# Altium footprint library Wireless Security Board.PcbLib: 38 footprints (part 2 of 3)
Each footprint in its own frame and in the unit in brackets; x right, y up, seen from the top. Pads: shape width x height; smd on the part's side, far side on the other; paste and mask are expansions set on the pad; w line width, h text height; cw(c..) or ccw(c..) is an arc to the next point about the centre after c.
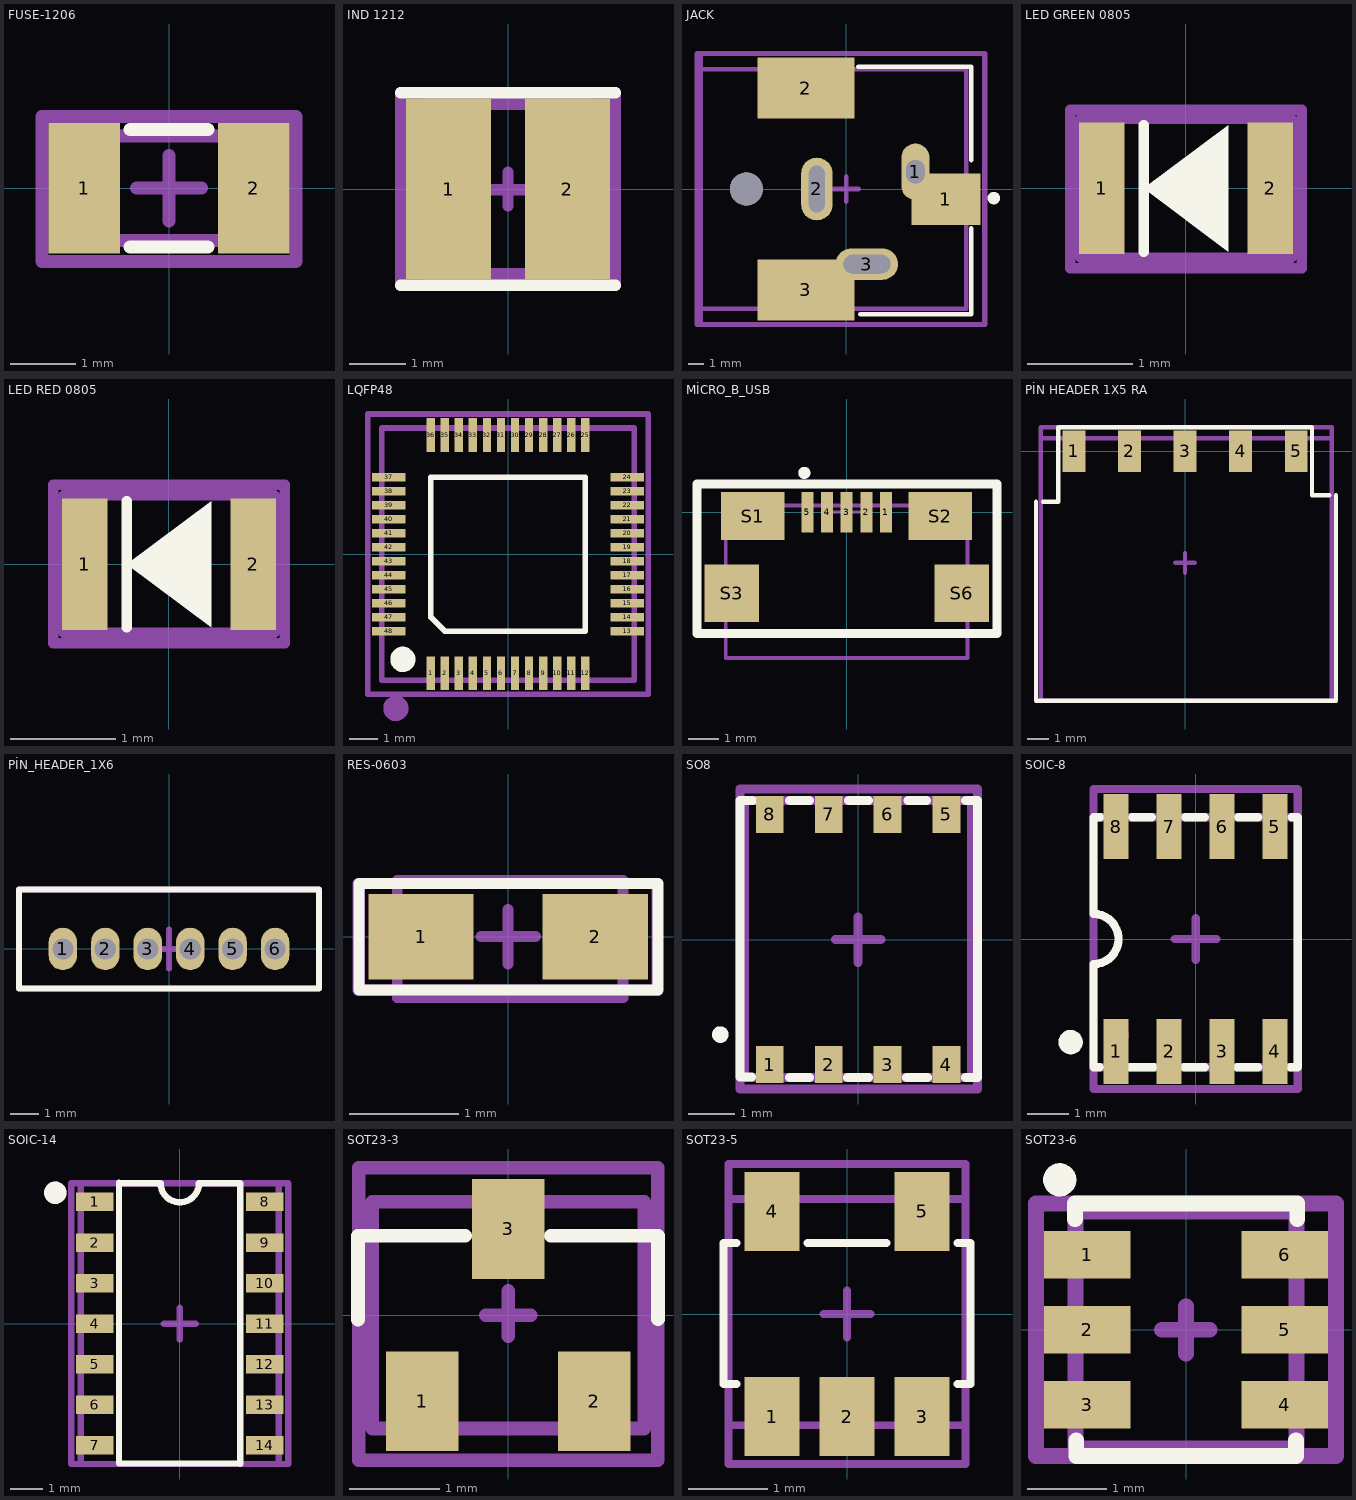
[diagram p1: the footprints below, top view; thin cyan lines are the x and y axes]

## FUSE-1206 [mm] "FUSE 3413.0216.22"
pads (2):
  rect 1.1x2 smd mask+0.05: 1(-1.3,0) 2(1.3,0)
Top Overlay:
  lines w0.2: -0.6,-0.9 0.6,-0.9 ; -0.6,0.9 0.6,0.9
Top 3D Body:
  lines w0.2: -1.6,-0.8 -1.6,0.8 1.6,0.8 1.6,-0.8 -1.6,-0.8
Top Component Center:
  lines w0.2: -0.5,0 0.5,0 ; 0,-0.5 0,0.5 ; -1.95,-1.125 -1.95,1.1 1.95,1.1 1.95,-1.125 -1.95,-1.125
Top Designator:
  lines w0.2: -1.95,-1.125 1.95,-1.125 1.95,1.1 -1.95,1.1 -1.95,-1.125
  text ".Designator" at -1.4,-0.133 h0.5
3D body "3413.0216.22.STEP": height 0.6, standoff 0, extent -1.6,-0.8 1.6,0.8

## IND 1212 [mm]
pads (2):
  rect 1.5x3.2 smd mask+0.05: 1(-1.05,0) 2(1.05,0)
Top Overlay:
  lines w0.2: -1.9,-1.7 1.9,-1.7 ; -1.9,1.7 1.9,1.7
Top 3D Body:
  lines w0.2: -1.5,-1.5 -1.5,1.5 1.5,1.5 1.5,-1.5 -1.5,-1.5
Top Component Center:
  lines w0.2: -0.304,-0.016 0.296,-0.016 ; 0,-0.3 0,0.3 ; -1.9,-1.7 -1.9,1.7 1.9,1.7 1.9,-1.7 -1.9,-1.7
Top Designator:
  lines w0.2: -1.9,-1.7 -1.9,1.7 1.9,1.7 1.9,-1.7 -1.9,-1.7
  text ".Designator" at -1.2,-0.233 h0.8
3D body "78438335010_Download_STP_WE-MAIA-3015_rev1.stp": height 1.2, standoff 0, extent -1.5,-1.5 1.5,1.5

## JACK [mm] "DC POWER JACK"
pads (7):
  oval 1.8x3.6 hole 1.2 slot 1.5 at 90 deg: 1(4.425,1.1)
  rect 4.4x3.3 smd: 1(6.375,-0.65)
  rect 6.2x3.9 smd: 2(-2.575,6.45) 3(-2.575,-6.45)
  oval 2x4 hole 1 slot 3 at 90 deg: 2(-1.875,0)
  oval 4x2 hole 1.2 slot 3 at 0 deg: 3(1.325,-4.8)
  round 2.1 hole 2.1 unplated: ""(-6.375,0)
Top Overlay:
  circle w0.4: c9.435,-0.58 r0.2
  lines w0.3: 0.775,7.8 8,7.8 8,1.85 ; 0.9,-8 8,-8 8,-2.5
Top 3D Body:
  lines w0.3: -9.425,-7.65 7.675,-7.65 7.675,7.65 -9.425,7.65 -9.425,-7.65
Top Component Center:
  lines w0.3: -0.8,0 0.8,0 ; 0,-0.8 0,0.8 ; -9.525,-8.65 8.875,-8.65 8.875,8.65 -9.525,8.65 -9.525,-8.65
Top Designator:
  lines w0.3: -9.3,-8.65 -5.925,-8.65 0.775,-8.65 8.825,-8.65 8.825,-2.55 8.825,1.25 8.825,8.65 0.775,8.65 -9.3,8.65 -9.3,4.425 -9.3,-8.65
  text ".Designator" at -8.175,-1.067 h2.5
3D body "PJ-037AH-SMT-TR.stp": height 11.2, standoff -3.2, extent -9.375,-7.65 7.725,7.55

## LED GREEN 0805 [mm]
pads (2):
  rect 0.43x1.25 smd mask+0.05: 1(-0.8,0) 2(0.8,0)
Top Overlay:
  region: -0.4,0 0.4,0.6 0.4,-0.6
  lines w0.1: -0.4,-0.6 -0.4,0.6
Top 3D Body:
  lines w0.1: -1,-0.66 1,-0.66 1,0.662 -1,0.662 -1,-0.66
Top Component Center:
  lines w0.1: -0.195,-0.004 0.205,-0.004 ; 0,-0.2 0,0.2 ; -1.1,-0.759 -1.1,0.747 1.1,0.747 1.1,-0.759 -1.1,-0.759
Top Designator:
  lines w0.1: -1.1,-0.759 -1.1,0.747 1.1,0.747 1.1,-0.759 -1.1,-0.759
  text ".Designator" at -0.85,-0.183 h0.5
3D body "everlight-17-21-0805LED-GREEN.step": height 1.1, standoff -0.01, extent -1,-0.625 1,0.625

## LED RED 0805 [mm]
pads (2):
  rect 0.43x1.25 smd mask+0.05: 1(-0.8,0) 2(0.8,0)
Top Overlay:
  region: -0.4,0 0.4,0.6 0.4,-0.6
  lines w0.1: -0.4,-0.6 -0.4,0.6
Top 3D Body:
  lines w0.1: -1.002,-0.649 -1.002,0.657 1,0.657 1,-0.649 -1.002,-0.649
Top Component Center:
  lines w0.1: -0.2,0 0.2,0 ; 0,-0.2 0,0.2 ; -1.1,-0.75 -1.1,0.755 1.1,0.755 1.1,-0.75 -1.1,-0.75
Top Designator:
  lines w0.1: -1.1,-0.75 -1.1,0.755 1.1,0.755 1.1,-0.75 -1.1,-0.75
  text ".Designator" at -1.05,-0.25 h0.6
3D body "everlight-17-21-0805LED-red.step": height 1.1, standoff -0.01, extent -1,-0.625 1,0.625

## LQFP48 [mm]
pads (48):
  rect 0.3x1.2 smd mask+0.05: 1(-2.75,-4.25) 2(-2.25,-4.25) 3(-1.75,-4.25) 4(-1.25,-4.25) 5(-0.75,-4.25) 6(-0.25,-4.25) 7(0.25,-4.25) 8(0.75,-4.25) 9(1.25,-4.25) 10(1.75,-4.25) 11(2.25,-4.25) 12(2.75,-4.25) 25(2.75,4.25) 26(2.25,4.25) 27(1.75,4.25) 28(1.25,4.25) 29(0.75,4.25) 30(0.25,4.25) 31(-0.25,4.25) 32(-0.75,4.25) 33(-1.25,4.25) 34(-1.75,4.25) 35(-2.25,4.25) 36(-2.75,4.25)
  rect 1.2x0.3 smd mask+0.05: 13(4.25,-2.75) 14(4.25,-2.25) 15(4.25,-1.75) 16(4.25,-1.25) 17(4.25,-0.75) 18(4.25,-0.25) 19(4.25,0.25) 20(4.25,0.75) 21(4.25,1.25) 22(4.25,1.75) 23(4.25,2.25) 24(4.25,2.75) 37(-4.25,2.75) 38(-4.25,2.25) 39(-4.25,1.75) 40(-4.25,1.25) 41(-4.25,0.75) 42(-4.25,0.25) 43(-4.25,-0.25) 44(-4.25,-0.75) 45(-4.25,-1.25) 46(-4.25,-1.75) 47(-4.25,-2.25) 48(-4.25,-2.75)
Top Overlay:
  circle w0.6: c-3.75,-3.75 r0.15
  lines w0.2: -2.75,-2.25 -2.25,-2.75 2.75,-2.75 2.75,2.75 -2.75,2.75 -2.75,-2.25
Top 3D Body:
  circle w0.5: c-4,-5.5 r0.2
  lines w0.2: -4.5,-4.5 4.5,-4.5 4.5,4.5 -4.5,4.5 -4.5,-4.5
Top Designator:
  lines w0.2: -5,-5 -5,5 5,5 5,-5 -5,-5
  text ".Designator" at -1.55,-0.542 h1.52
3D body "LQFP48.STEP": height 1.6, standoff 0, extent -4.509,-4.509 4.509,4.509

## MİCRO_B_USB [mm] "CONN RCPT USB2.0 MICRO B SMD R/A"
pads (9):
  rect 0.4x1.35 smd: 1(1.3,0) 2(0.65,0) 3(0,0) 4(-0.65,0) 5(-1.3,0)
  rect 2.1x1.6 smd: S1(-3.1,-0.125) S2(3.1,-0.125)
  rect 1.8x1.9 smd: S3(-3.8,-2.675) S6(3.8,-2.675)
Top Overlay:
  circle w0.2: c-1.4,1.3 r0.1
  lines w0.3: -4.949,-4.005 -4.949,0.928 4.972,0.928 4.972,-4.005 -4.949,-4.005
Top 3D Body:
  circle w0.2: c-1.4,1.3 r0.1
  lines w0.127: -4,-4.825 -4,0.225 4,0.225 4,-4.825 -4,-4.825
Top Component Center:
  lines w0.1: -0.5,0 0.5,0 ; 0,-0.5 0,0.5 ; -4.95,-4.1 -4.95,0.925 4.95,0.925 4.95,-4.1 -4.95,-4.1
Top Designator:
  lines w0.1: -4.95,-4.1 -4.95,0.925 4.95,0.925 4.95,-4.1 -4.95,-4.1
  text ".Designator" at -4.05,-2.584 h1.7
3D body "step_temp.STEP": height 2.7, standoff 0, extent -3.95,-4.825 3.95,0.275

## PİN HEADER 1X5 RA [mm] "CONN RCPT 5POS 0.1 GOLD SMD R/A"
pads (5):
  rect 1.04x1.91 smd mask+0: 1(-5.08,0) 2(-2.54,0) 3(0,0) 4(2.54,0) 5(5.08,0)
Top Overlay:
  lines w0.2: -6.811,-2.3 -6.811,-11.4 6.9,-11.4 6.9,-2 ; -6.493,-2.3 -5.8,-2.3 -5.8,1.1 5.79,1.1 ; 5.8,1.09 5.8,-2 6.6,-2
Top 3D Body:
  lines w0.2: -6.6,-11.4 -6.6,0.6 6.7,0.6 6.7,-11.4 -6.6,-11.4
Top Component Center:
  lines w0.2: -0.45,-5.1 0.45,-5.1 ; 0,-5.55 0,-4.65 ; -6.6,-11.4 -6.6,1.1 6.7,1.1 6.7,-11.4 -6.6,-11.4
Top Designator:
  lines w0.2: -6.6,-11.4 6.7,-11.4 6.7,1.1 -6.6,1.1 -6.6,-11.4
  text ".Designator" at -5.35,-6.317 h2.5
3D body "SMH-105-02-L-S.stp": height 2.51, standoff 0.09, extent -6.6,-11.346 6.608,0.592

## PİN_HEADER_1X6 [mm]
pads (6):
  oval 1x1.5 hole 0.75 mask+0.05: 1(-3.75,0) 2(-2.25,0) 3(-0.75,0) 4(0.75,0) 5(2.25,0) 6(3.75,0)
Top Overlay:
  lines w0.2: -5.3,-1.4 5.3,-1.4 5.3,2.1 -5.3,2.1 -5.3,-1.4
Top 3D Body:
  lines w0.2: -5.3,-1.4 5.3,-1.4 5.3,2.1 -5.3,2.1 -5.3,-1.4
Top Component Center:
  lines w0.2: -0.689,-0.005 0.711,-0.005 ; 0,-0.7 0,0.7 ; -5.3,-1.4 -5.3,2.1 5.3,2.1 5.3,-1.4 -5.3,-1.4
Top Designator:
  lines w0.2: -5.3,-1.4 5.3,-1.4 5.3,2.1 -5.3,2.1 -5.3,-1.4
  text ".Designator" at -4.9,-0.4 h1.5
3D body "64800611622 (rev1).stp": height 4.95, standoff -2.25, extent -5.25,-1.4 5.25,2.1

## RES-0603 [mil]
pads (2):
  rect 38x31 smd mask+1.97: 1(-31.5,0) 2(31.5,0)
Top Overlay:
  lines w3.94: -53.9,-19.3 -53.9,19.2 54.2,19.2 54.2,-19.3 -53.9,-19.3
Top 3D Body:
  lines w3.94: -40.1,-22.1 -40.1,20.4 41.5,20.4 41.5,-22.1 -40.1,-22.1
Top Component Center:
  lines w3.94: -9.84,0 9.84,0 ; 0,-9.84 0,9.84 ; -53.7,-19.3 -53.7,19.2 53.8,19.2 53.8,-19.3 -53.7,-19.3
Top Designator:
  lines w3.94: -54.3,-19.5 54.1,-19.5 54.1,19.2 -54.3,19.2 -54.3,-19.5
  text ".Designator" at -27.76,-6.9 h19.68
3D body "0603S1.STEP": height 16.89, standoff -0.83, extent -38.42,-19.96 39.42,18.6

## SO8 [mm]
pads (8):
  rect 0.6x0.8 smd mask+0.05: 1(-1.905,-2.7) 2(-0.635,-2.7) 3(0.635,-2.7) 4(1.905,-2.7) 5(1.905,2.7) 6(0.635,2.7) 7(-0.635,2.7) 8(-1.905,2.7)
Top Overlay:
  circle w0.2: c-2.975,-2.05 r0.079
  lines w0.2: -2.3,-2.966 -2.55,-2.966 -2.55,3 -2.275,3 ; -1.475,-2.975 -1.05,-2.975 ; -1.475,3 -1.05,3 ; -0.225,-2.975 0.225,-2.975 ; -0.2,3 0.225,3 ; 1.05,-2.975 1.5,-2.975 ; 1.075,3 1.475,3 ; 2.325,-2.975 2.575,-2.975 2.575,3 2.325,3
Top 3D Body:
  lines w0.2: -2.45,3 -2.45,3 ; -2.45,3 2.45,3 2.45,-2.975 -2.45,-2.975 -2.45,3
Top Component Center:
  lines w0.2: -0.487,0 0.487,0 ; 0,-0.487 0,0.487 ; -2.55,-3.225 2.575,-3.225 2.575,3.25 -2.55,3.25 -2.55,-3.225
Top Designator:
  lines w0.2: -2.45,-2.975 -2.45,3 2.45,3 2.45,-2.975 -2.45,-2.975
  text ".Designator" at -1.475,-0.258 h0.5
3D body "M41T00M6F.STEP": height 1.75, standoff 0, extent -2.45,-3 2.45,3

## SOIC-8 [mm]
pads (8):
  rect 0.6x1.55 smd mask+0.05: 1(-1.905,-2.7) 2(-0.635,-2.7) 3(0.635,-2.7) 4(1.905,-2.7) 5(1.905,2.7) 6(0.635,2.7) 7(-0.635,2.7) 8(-1.905,2.7)
Top Overlay:
  circle w0.3: c-3,-2.475 r0.141
  lines w0.2: -2.3,-3.075 -2.45,-3.075 -2.45,-0.601 ccw(c-2.45,0) -2.45,0.601 -2.45,2.924 -2.285,2.924 ; -1.575,-3.075 -1,-3.075 ; -1.525,2.925 -1.05,2.925 ; -0.275,-3.075 0.225,-3.075 ; -0.25,2.925 0.225,2.925 ; 1,-3.075 1.5,-3.075 ; 1.025,2.925 1.5,2.925 ; 2.275,-3.075 2.45,-3.075 2.45,2.925 2.3,2.925
Top 3D Body:
  circle w0.3: c-1.9,-2.325 r0.141
  lines w0.2: -2.45,-3.075 2.45,-3.075 2.45,2.925 -2.45,2.925 -2.45,-3.075
Top Component Center:
  lines w0.2: -0.5,0 0.5,0 ; 0,-0.5 0,0.5 ; -2.45,-3.6 2.45,-3.6 2.45,3.6 -2.45,3.6 -2.45,-3.6
Top Designator:
  lines w0.2: -2.45,-3.6 2.45,-3.6 2.45,3.6 -2.45,3.6 -2.45,-3.6
  text ".Designator" at -1.245,-0.337 h1
3D body "User Library-SOIC-8-1.step": height 1.75, standoff 0, extent -2.455,-3.075 2.445,2.925

## SOIC-14 [mm]
pads (15):
  rect 1.18x0.58 smd mask+0.05: 1(-2.66,3.81) 1(-2.66,3.81) 2(-2.66,2.54) 3(-2.66,1.27) 4(-2.66,0) 5(-2.66,-1.27) 6(-2.66,-2.54) 7(-2.66,-3.81) 8(2.66,3.81) 9(2.66,2.54) 10(2.66,1.27) 11(2.66,0) 12(2.66,-1.27) 13(2.66,-2.54) 14(2.66,-3.81)
Top Overlay:
  circle w0.35: c-3.9,4.1 r0.175
  lines w0.2: -1.904,4.417 -1.904,-4.383 1.896,-4.383 ; -1.887,4.4 -0.6,4.4 ccw(c0,4.4) 0.6,4.4 1.9,4.4 1.9,-4.4
Top 3D Body:
  circle w0.35: c-3.9,4.1 r0.175
  lines w0.2: -3.1,-4.4 3.1,-4.4 3.1,4.4 -3.1,4.4 -3.1,-4.4
Top Component Center:
  lines w0.2: -0.5,0 0.5,0 ; 0,-0.5 0,0.5 ; -3.4,-4.4 3.4,-4.4 3.4,4.4 -3.4,4.4 -3.4,-4.4
Top Designator:
  lines w0.2: -3.4,-4.4 3.4,-4.4 3.4,4.4 -3.4,4.4 -3.4,-4.4
  text ".Designator" at -3.15,-0.65 h1.5
3D body "soic-14.stp": height 1.57, standoff -0.03, extent -3.023,-4.318 3.023,4.318

## SOT23-3 [mm]
pads (3):
  rect 0.8x1.1 smd mask+0.05: 1(-0.95,-0.95) 2(0.95,-0.95) 3(0,0.95)
Top Overlay:
  lines w0.15: -1.657,-0.05 -1.657,0.875 -0.475,0.875 ; 0.47,0.878 1.652,0.878 1.652,-0.047
Top 3D Body:
  lines w0.15: -1.5,-1.25 1.5,-1.25 1.5,1.25 -1.5,1.25 -1.5,-1.25
Top Component Center:
  lines w0.15: -0.25,0 0.25,0 ; 0,-0.233 0,0.267 ; -1.65,-1.6 -1.65,1.625 1.65,1.625 1.65,-1.6 -1.65,-1.6
Top Designator:
  lines w0.15: -1.65,-1.6 -1.65,1.625 1.65,1.625 1.65,-1.6 -1.65,-1.6
  text ".Designator" at -1,-0.1 h0.3
3D body "SOT23-3.step": height 1.1, standoff 0, extent -1.499,-1.25 1.499,1.25

## SOT23-5 [mm]
pads (5):
  rect 0.7x1 smd mask+0.05: 1(-0.95,-1.3) 2(0,-1.3) 3(0.95,-1.3) 4(-0.95,1.3) 5(0.95,1.3)
Top Overlay:
  lines w0.1: -1.4,-0.889 -1.562,-0.889 -1.562,0.9 -1.4,0.9 ; -0.5,0.9 0.5,0.9 ; 1.4,-0.889 1.562,-0.889 1.562,0.9 1.4,0.9
Top 3D Body:
  lines w0.1: -1.5,-1.409 1.5,-1.409 1.5,1.455 -1.5,1.455 -1.5,-1.409
Top Component Center:
  lines w0.1: -0.3,0 0.3,0 ; 0,-0.3 0,0.3 ; -1.5,-1.9 -1.5,1.9 1.5,1.9 1.5,-1.9 -1.5,-1.9
Top Designator:
  lines w0.1: -1.5,-1.9 1.5,-1.9 1.5,1.9 -1.5,1.9 -1.5,-1.9
  text ".Designator" at -1.25,-0.2 h0.75
3D body "SOT23-5.stp": height 1.2, standoff 0.02, extent -1.5,-1.418 1.5,1.418

## SOT23-6 [mm]
pads (6):
  rect 1.1x0.6 smd mask+0.05: 1(-1.25,0.95) 2(-1.25,0) 3(-1.25,-0.95) 4(1.25,-0.95) 5(1.25,0) 6(1.25,0.95)
Top Overlay:
  circle w0.22: c-1.6,1.9 r0.1
  lines w0.2: -1.406,1.4 -1.406,1.6 1.41,1.6 1.41,1.4 ; -1.39,-1.4 -1.39,-1.6 1.394,-1.6 1.394,-1.4
Top 3D Body:
  lines w0.2: -1.4,-1.5 1.4,-1.5 1.4,1.5 -1.4,1.5 -1.4,-1.5
Top Component Center:
  lines w0.2: -0.303,0 0.297,0 ; 0,-0.301 0,0.299 ; -1.9,-1.6 1.9,-1.6 1.9,1.6 -1.9,1.6 -1.9,-1.6
Top Designator:
  lines w0.2: -1.9,-1.6 1.9,-1.6 1.9,1.6 -1.9,1.6 -1.9,-1.6
  text ".Designator" at -1.4,-0.267 h1
3D body "USBLC6-2SC6.STEP": height 1.4, standoff -0.05, extent -1.4,-1.462 1.4,1.462